# Altium footprint library ACTION_Connector.PcbLib: 138 footprints (part 9 of 9)
Each footprint in its own frame and in the unit in brackets; x right, y up, seen from the top. Pads: shape width x height; smd on the part's side, far side on the other; paste and mask are expansions set on the pad; w line width, h text height; cw(c..) or ccw(c..) is an arc to the next point about the centre after c.
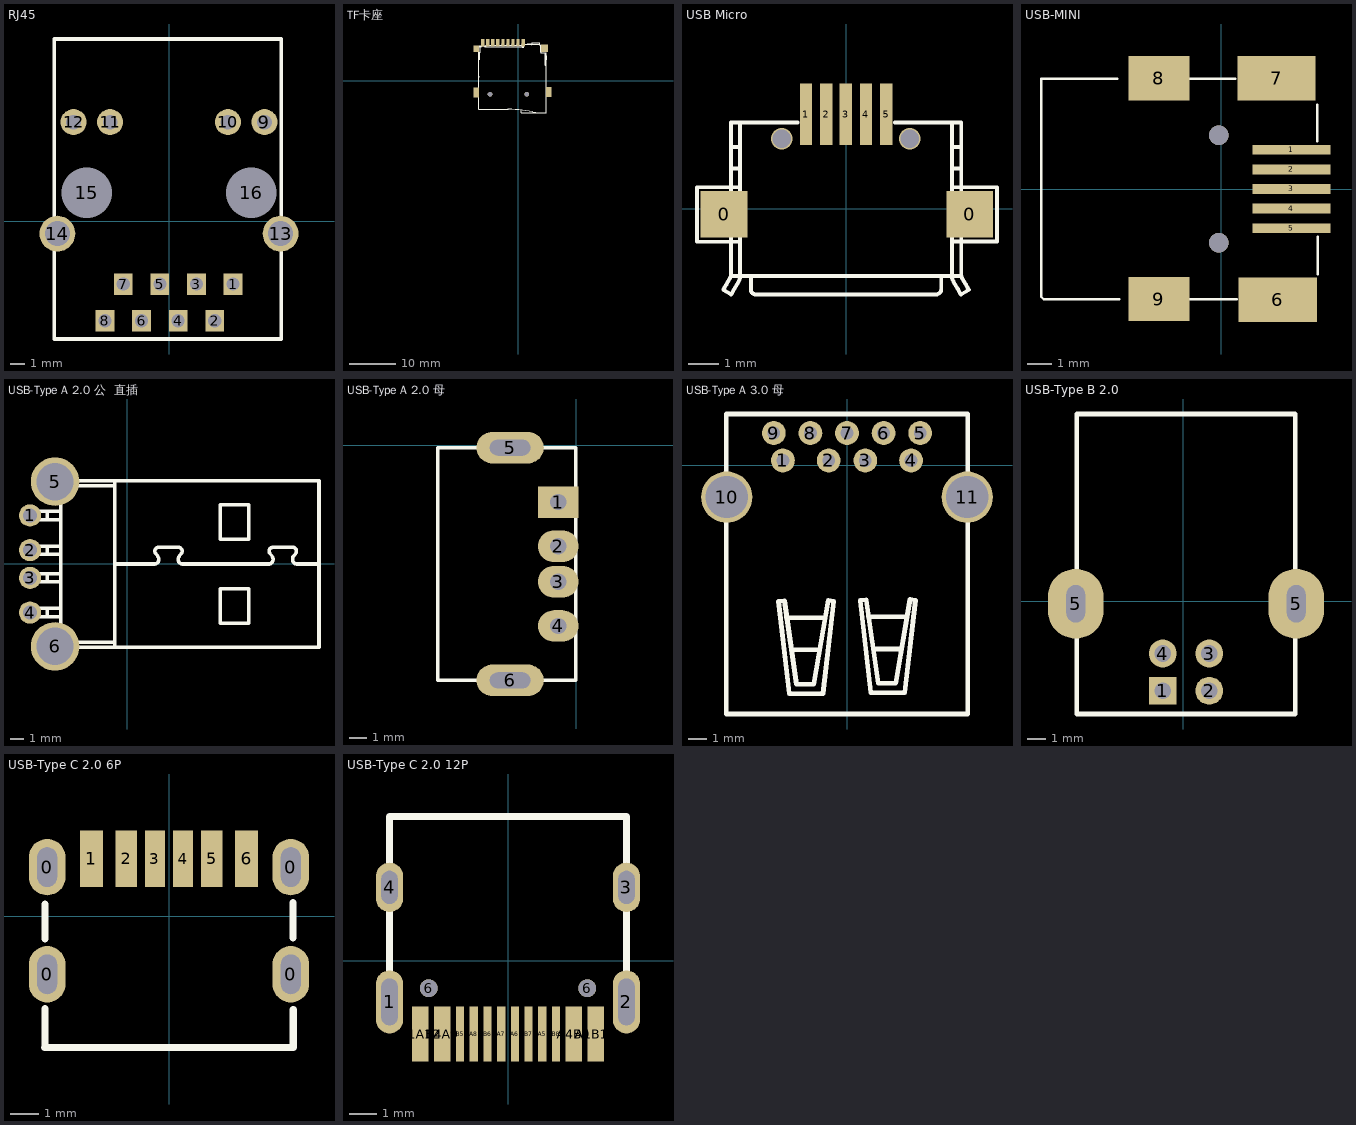
[diagram p8: the footprints below, top view; thin cyan lines are the x and y axes]

## RJ45 [mil]
pads (16):
  rect 51x59 hole 36: 1(175,-171.5) 2(125,-271.5) 3(75,-171.5) 4(25,-271.5) 5(-25,-171.5) 6(-75,-271.5) 7(-125,-171.5) 8(-175,-271.5)
  round 71 hole 40: 9(261,271.5) 10(161,271.5) 11(-161,271.5) 12(-261,271.5)
  round 98 hole 68: 13(305,-33.5) 14(-305,-33.5)
  round 79 hole 138: 15(-225,78.5) 16(225,78.5)
Top Overlay:
  lines w10: -313.5,-321.4 306.5,-321.4 306.5,498.6 -313.5,498.6 -313.5,-321.4
Top Paste:
  lines w23.6: -123,-308.4 -123,-233.6 ; -74.8,-208.2 -74.8,-134 ; -23,-308.4 -23,-233.6 ; 25.2,-208.2 25.2,-134 ; 77,-308.4 77,-233.6 ; 125.2,-208.2 125.2,-134
  lines w35.4: -194.4,-220.6 194.1,-220.6
3D body: height 10, standoff 0, extent 0,0 0,0
3D body "User Library-HR911105A.STEP": height 551.18, standoff -98.43, extent -315.6,-333 309.6,509.52

## TF卡座 [mm]
height 2
pads (15):
  round 1 hole 1: 0(-6.096,-2.921) 0(1.904,-2.921)
  rect 0.7x1.6 smd: 1(1.137,8.306) 2(-0.006,8.306) 3(-1.105,8.306) 4(-2.203,8.306) 5(-3.302,8.306) 6(-4.401,8.306) 7(-5.499,8.306) 8(-6.598,8.306) 9(-7.696,8.306)
  rect 1.2x1.5 smd: 10(-9.068,6.985)
  rect 1.2x2.2 smd: 11(-9.042,-2.515) 13(6.731,-2.464)
  rect 1.5x1.6 smd: 12(5.791,7.061)
Top Overlay:
  drawing of 244 lines, arcs and shapes, not listed
3D body "User Library-MEM2055-00-190-01-A_revG.STEP": height 1.85, standoff -0.6, extent -9.169,-6.893 6.831,8.357

## USB Micro [mil]
pads (7):
  rect 60x60 smd: 0(-157,-7) 0(158,-7)
  rect 15.75x78.74 smd: 1(-52,121.38) 2(-26,121.38) 3(-1,121.38) 4(25,121.38) 5(51,121.38)
via -83,90 diameter 27.56 hole 23.62
via 81,90 diameter 27.56 hole 23.62
Top Overlay:
  drawing of 151 lines, arcs and shapes, not listed
3D body "65944.stp": height 7.87, standoff -122.05, extent -158.49,-120.93 156.48,117.01

## USB-MINI [mm]
pads (9):
  rect 3.2x0.4 smd: 1(2.871,1.6) 2(2.871,0.8) 3(2.871,0) 4(2.871,-0.8) 5(2.871,-1.6)
  rect 3.2x1.8 smd: 6(2.311,-4.521) 7(2.26,4.521)
  rect 2.5x1.8 smd: 8(-2.54,4.521) 9(-2.54,-4.496)
via -0.104,2.2 diameter 0.8 hole 0.8
via -0.104,-2.2 diameter 0.8 hole 0.8
Top Overlay:
  lines w0.1: -4.839,4.5 -7.339,4.5 -7.339,-4.4 -7.239,-4.5 -4.739,-4.5
  lines w0.102: -4.839,4.5 -4.246,4.5 ; -4.739,-4.5 -4.169,-4.5 -4.165,-4.496 ; -1.6,-4.496 0.636,-4.496 ; -1.574,4.496 0.585,4.496 ; 3.912,1.956 3.912,3.429 ; 3.938,-3.48 3.938,-1.956
3D body "USB_mini_B.STEP": height 3.95, standoff -1, extent -5.976,-5.299 3.224,5.401

## USB-Type A 2.0 公  直插 [mm]
pads (6):
  round 1.6 hole 1: 1(-7.01,3.505) 2(-7.01,1.003) 3(-7.01,-1.003) 4(-7.01,-3.505)
  round 3.5 hole 2.7: 5(-5.21,5.946) 6(-5.21,-5.946)
Top Overlay:
  lines w0.254: -5.766,-3.81 -5.766,-3.2 ; -5.766,-1.295 -5.766,-0.711 ; -5.766,0.711 -5.766,1.295 ; -4.798,-6.426 -4.798,-5.994 ; -4.798,6.426 -4.798,5.994 ; 1.981,0 -0.914,0 ; 1.991,-0.01 ccw(c1.935,0.329) 2.217,0.526 ; 2.032,0.787 2.212,0.533 ; 2.037,0.79 cw(c2.25,0.939) 2.25,1.199 ; 2.235,1.219 3.711,1.219 ; 3.711,1.199 cw(c3.708,0.939) 3.922,0.79 ; 3.736,0.533 3.912,0.787 ; 3.744,0.526 ccw(c4.026,0.329) 3.97,-0.01 ; 3.965,0 10.236,0 ; 10.241,-0.01 ccw(c10.185,0.329) 10.467,0.526 ; 10.287,0.787 10.467,0.533 ; 10.287,0.79 cw(c10.5,0.939) 10.5,1.199 ; 10.49,1.219 11.938,1.219 ; 11.961,1.199 cw(c11.958,0.939) 12.172,0.79 ; 11.966,0.533 11.991,0.533 12.167,0.787 ; 11.994,0.526 ccw(c12.276,0.329) 12.22,-0.01 ; 12.22,0 13.843,0 ; -5.766,3.2 -5.766,3.81 ; -5.766,3.2 -7.01,3.2 -7.01,3.81 -5.766,3.81 ; -5.766,3.2 -4.798,3.2 ; -5.766,3.81 -4.798,3.81 ; -4.798,-5.994 -2.819,-5.994 -0.914,-5.994 ; -4.798,-5.994 -4.798,-5.639 ; -4.798,-5.639 -0.914,-5.639 ; -4.798,-5.639 -4.798,-3.81 ; -4.798,-3.81 -7.01,-3.81 -7.01,-3.2 -4.798,-3.2 ; -4.798,-3.81 -4.798,-3.2 ; -4.798,-3.2 -4.798,-1.295 ; -4.798,-1.295 -7.01,-1.295 -7.01,-0.711 -4.798,-0.711 ; -4.798,-1.295 -4.798,-0.711 ; -4.798,-0.711 -4.798,0.711 ; -4.798,0.711 -7.01,0.711 -7.01,1.295 -4.798,1.295 ; -4.798,0.711 -4.798,1.295 ; -4.798,1.295 -4.798,3.2 ; -4.798,3.2 -4.798,3.81 ; -4.798,3.81 -4.798,5.639 ; -4.798,5.639 -2.819,5.639 -0.914,5.639 ; -4.798,5.639 -4.798,5.994 ; -4.798,5.994 -2.819,5.994 -0.914,5.994 ; -0.914,-5.994 -0.914,-5.639 ; -0.914,-5.994 13.843,-5.994 13.843,0 ; -0.914,-5.639 -0.914,0 ; -0.914,0 -0.914,5.639 ; -0.914,5.639 -0.914,5.994 ; -0.914,5.994 13.843,5.994 13.843,0 ; 6.706,-4.267 6.706,-1.778 8.763,-1.778 8.763,-4.267 6.706,-4.267 ; 6.706,1.778 6.706,4.267 8.763,4.267 8.763,1.778 6.706,1.778
3D body "usb_a-usb_a-lp-c.stp": height 4.5, standoff -1.3, extent -7.087,-6.405 12.838,6.201

## USB-Type A 2.0 母 [mil]
pads (6):
  rect 90x70 hole 36: 1(-40,-126)
  oval 90x70 hole 36: 2(-40,-224.43) 3(-40,-303.17) 4(-40,-401.59)
  oval 149.61x70 hole 90.55 slot 35 at 90 deg: 5(-146.69,-5.13) 6(-146.69,-522.46)
Top Overlay:
  lines w8: -308,-522.46 -0.63,-522.46 -0.63,-5.13 -308,-5.13 -308,-522.46
3D body "USB-A DIP.STEP": height 273.62, standoff -165.35, extent -538.68,-575 0.68,47.05

## USB-Type A 3.0 母 [mm]
pads (11):
  round 1.3 hole 0.7: 1(-3.5,0.25) 2(-1,0.25) 3(1,0.25) 4(3.5,0.25) 5(4,1.75) 6(2,1.75) 7(0,1.75) 8(-2,1.75) 9(-4,1.75)
  round 2.8 hole 2.3: 10(-6.57,-1.75) 11(6.57,-1.75)
Top Overlay:
  lines w0.254: -3.316,-8.348 -1.233,-8.348 ; -2.986,-10.1 -1.538,-10.1 ; 1.154,-8.297 3.237,-8.297 ; 1.485,-10.05 2.932,-10.05 ; -6.604,-13.602 6.604,-13.602 6.604,2.79 -6.604,2.79 -6.604,-13.602 ; -3.745,-7.441 -3.412,-7.416 -2.757,-11.98 -1.817,-11.98 -1.03,-7.383 -0.725,-7.433 -1.309,-12.488 -3.164,-12.488 -3.745,-7.441 ; 0.725,-7.39 1.307,-12.437 3.161,-12.437 3.745,-7.383 3.44,-7.332 2.653,-11.929 1.713,-11.929 1.058,-7.365 0.725,-7.39
3D body "usb_3_a_90.stp": height 8, standoff -3.5, extent -8.05,-13.602 8.05,2.848

## USB-Type B 2.0 [mil]
pads (6):
  rect 60x60 hole 36: 1(-44,-192)
  round 60 hole 36: 2(56,-192) 3(56,-112) 4(-44,-112)
  oval 120x150 hole 80 slot 40 at 0 deg: 5(-231,-5) 5(243,-5)
Top Overlay:
  lines w10: -229,-242 -229,-2 -229,403 241,403 241,273 241,-2 241,-242 -229,-242
3D body "USB_B.STEP": height 393.7, standoff -182.79, extent -280.27,-247 302.27,402.61

## USB-Type C 2.0 6P [mm]
pads (10):
  oval 1.3x2 hole 0.7 slot 1.401 at 90 deg: 0(-4.32,-2.051) 0(-4.32,1.749) 0(4.32,-2.051) 0(4.32,1.749)
  rect 0.8x2 smd: 1(-2.75,2.051) 6(2.75,2.051)
  rect 0.76x2 smd: 2(-1.52,2.051) 5(1.52,2.051)
  rect 0.7x2 smd: 3(-0.5,2.051) 4(0.5,2.051)
Top Overlay:
  lines w0.254: -4.41,-4.651 4.41,-4.651 ; -4.4,-4.651 -4.4,-3.271 ; -4.4,-0.801 -4.4,0.439 ; 4.4,-0.753 4.4,0.487 ; 4.409,-4.652 4.409,-3.301

## USB-Type C 2.0 12P [mm]
pads (18):
  oval 1x2.3 hole 0.6 slot 1.702 at 90 deg: 1(-4.321,-1.503) 2(4.321,-1.503)
  oval 1x1.8 hole 0.6 slot 1.199 at 90 deg: 3(4.321,2.675) 4(-4.321,2.675)
  round 0.65 hole 0.65: 6(-2.891,-1.004) 6(2.891,-1.004)
  rect 0.6x2 smd: A1B12(3.202,-2.675) A4B9(2.402,-2.675) B1A12(-3.198,-2.675) B4A9(-2.398,-2.675)
  rect 0.3x2 smd: A5(1.252,-2.675) A6(0.253,-2.675) A7(-0.249,-2.675) A8(-1.248,-2.675) B5(-1.748,-2.675) B6(-0.747,-2.675) B7(0.751,-2.675) B8(1.752,-2.675)
Top Overlay:
  lines w0.254: -4.321,-1.503 -4.321,2.675 -4.321,5.258 4.321,5.258 4.321,2.675 4.321,-1.503
3D body "User Library-USB - C.step": height 3.26, standoff -1, extent -4.475,-2.416 4.475,5.334